# Altium footprint library 7-Connectors-12.PcbLib: 76 footprints (part 4 of 5)
Each footprint in its own frame and in the unit in brackets; x right, y up, seen from the top. Pads: shape width x height; smd on the part's side, far side on the other; paste and mask are expansions set on the pad; w line width, h text height; cw(c..) or ccw(c..) is an arc to the next point about the centre after c.
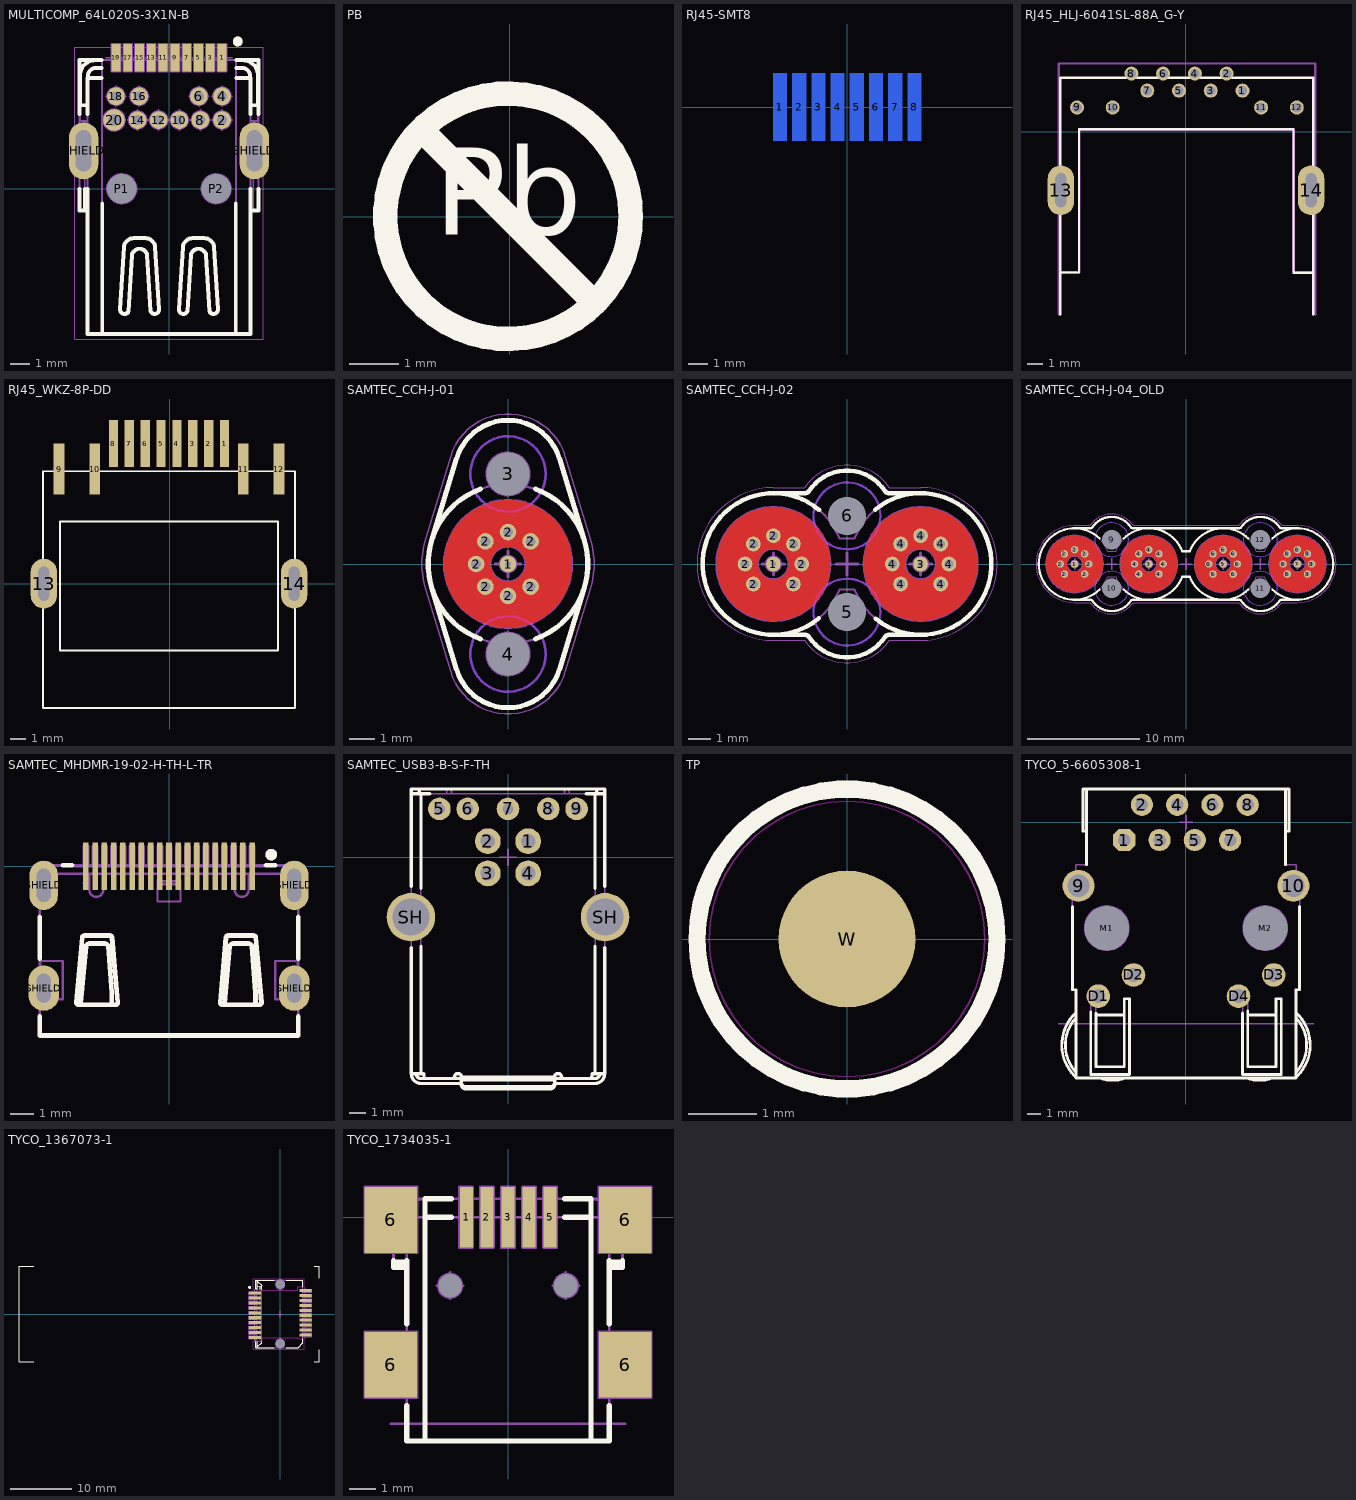
[diagram p3: the footprints below, top view; thin cyan lines are the x and y axes]

## MULTICOMP_64L020S-3X1N-B [mm] "0.4mm Pitch, Mini DisplayPort Receptacle, 20 Positions, Right Angled"
height 8.2
pads (24):
  rect 0.45x1.4 smd: 1(2.7,6.67) 3(2.1,6.67) 5(1.5,6.67) 7(0.9,6.67) 9(0.3,6.67) 11(-0.3,6.67) 13(-0.9,6.67) 15(-1.5,6.67) 17(-2.1,6.67) 19(-2.7,6.67)
  round 0.9 hole 0.5: 2(2.7,3.5) 4(2.7,4.71) 6(1.52,4.71) 8(1.6,3.5) 10(0.53,3.5) 12(-0.53,3.5) 14(-1.6,3.5) 16(-1.52,4.71) 18(-2.7,4.71)
  round 1.1 hole 0.6: 20(-2.8,3.5)
  round 1 hole 1.5 unplated mask+0.25: P1(-2.4,0) P2(2.4,0)
  oval 1.5x2.9 hole 0.8 slot 2.1 at 90 deg: SHIELD(-4.35,1.93) SHIELD(4.35,1.93)
Top Overlay:
  circle w0.25: c3.5,7.5 r0.125
  lines w0.2: -4.557,0 -4.557,-1.11 -4.15,-1.11 ; -4.557,3.81 -4.557,6.552 -3.425,6.552 ; -4.557,5.63 -4.536,5.63 ; -4.29,-1.11 -4.29,0 ; -4.15,0 -4.15,-7.4 4.15,-7.4 4.15,0 ; -4.15,3.81 -4.15,5.63 -3.425,5.63 ; -4.15,4.252 -4.536,4.252 -4.536,5.752 cw(c-3.736,5.752) -3.736,6.552 ; -4.129,5.63 -4.129,5.752 cw(c-3.729,5.752) -3.729,6.152 -3.425,6.152 ; -3.4,-7.4 -3.4,-0.75 ; -0.946,-6.234 -1.113,-3.392 ccw(c-1.5,-3.446) -1.888,-3.394 -2.058,-6.234 cw(c-2.267,-6.151) -2.492,-6.137 -2.293,-2.984 cw(c-1.794,-3.016) -1.794,-2.516 -1.206,-2.516 cw(c-1.206,-3.016) -0.707,-2.984 -0.508,-6.137 cw(c-0.733,-6.151) -0.942,-6.234 ; 0.942,-6.234 cw(c0.733,-6.151) 0.508,-6.137 0.707,-2.984 cw(c1.206,-3.016) 1.206,-2.516 1.794,-2.516 cw(c1.794,-3.016) 2.293,-2.984 2.492,-6.137 cw(c2.267,-6.151) 2.058,-6.234 1.888,-3.394 ccw(c1.5,-3.446) 1.113,-3.392 0.946,-6.234 ; 3.4,-7.4 3.4,-0.75 ; 3.425,5.63 4.15,5.63 4.15,3.81 ; 3.425,6.152 3.729,6.152 cw(c3.729,5.752) 4.129,5.752 4.129,5.63 ; 3.425,6.552 4.557,6.552 4.557,3.81 ; 3.736,6.552 cw(c3.736,5.752) 4.536,5.752 4.536,4.252 4.15,4.252 ; 4.15,-1.11 4.557,-1.11 4.557,0 ; 4.536,5.63 4.557,5.63
Mechanical 8:
  drawing of 167 lines, arcs and shapes, not listed
  text "8" at 1.513,2.486 h0.25
  text "20" at -2.972,2.486 h0.25
  text "16" at -0.762,4.572 h0.25
  text "14" at -1.763,2.486 h0.25
  text "12" at -0.688,2.486 h0.25
  text "10" at 0.38,2.486 h0.25
  text "6" at 0.635,4.572 h0.25
  text "2" at 2.608,2.486 h0.25
  text "4" at 3.4,4.572 h0.25
  text "18" at -3.81,4.572 h0.25
  text "19" at -2.859,5.581 h0.25
  text "17" at -2.25,5.581 h0.25
  text "15" at -1.655,5.581 h0.25
  text "13" at -1.055,5.581 h0.25
  text "11" at -0.425,5.581 h0.25
  text "9" at 0.208,5.581 h0.25
  text "7" at 0.813,5.581 h0.25
  text "5" at 1.407,5.581 h0.25
  text "3" at 2.007,5.581 h0.25
  text "1" at 2.638,5.581 h0.25
Mechanical 14:
  circle w0.25: c3.5,7.5 r0.125
  lines w0.1: -4.557,5.63 -4.536,5.63 ; -4.536,4.252 -4.15,4.252 ; -4.29,-1.11 -4.29,3.452 ; -4.15,-1.11 -4.557,-1.11 -4.557,6.552 4.557,6.552 4.557,-1.11 4.15,-1.11 ; -4.15,3.452 -4.536,3.452 -4.536,5.752 cw(c-3.736,5.752) -3.736,6.552 ; -4.129,5.63 -4.129,5.752 cw(c-3.729,5.752) -3.729,6.152 -3.4,6.152 ; -3.4,-7.4 -3.4,6.552 ; -3.4,5.63 -4.15,5.63 -4.15,-7.4 4.15,-7.4 4.15,5.63 3.4,5.63 ; -2.8,6.552 -2.8,6.96 -2.6,6.96 -2.6,6.552 ; -2.2,6.552 -2.2,6.96 -2,6.96 -2,6.552 ; -1.6,6.552 -1.6,6.96 -1.4,6.96 -1.4,6.552 ; -1,6.552 -1,6.96 -0.8,6.96 -0.8,6.552 ; -0.946,-6.234 -1.113,-3.392 ccw(c-1.5,-3.446) -1.888,-3.394 -2.058,-6.234 cw(c-2.267,-6.151) -2.492,-6.137 -2.293,-2.984 cw(c-1.794,-3.016) -1.794,-2.516 -1.206,-2.516 cw(c-1.206,-3.016) -0.707,-2.984 -0.508,-6.137 cw(c-0.733,-6.151) -0.942,-6.234 ; -0.4,6.552 -0.4,6.96 -0.2,6.96 -0.2,6.552 ; 0.2,6.552 0.2,6.96 0.4,6.96 0.4,6.552 ; 0.8,6.552 0.8,6.96 1,6.96 1,6.552 ; 0.942,-6.234 cw(c0.733,-6.151) 0.508,-6.137 0.707,-2.984 cw(c1.206,-3.016) 1.206,-2.516 1.794,-2.516 cw(c1.794,-3.016) 2.293,-2.984 2.492,-6.137 cw(c2.267,-6.151) 2.058,-6.234 1.888,-3.394 ccw(c1.5,-3.446) 1.113,-3.392 0.946,-6.234 ; 1.4,6.552 1.4,6.96 1.6,6.96 1.6,6.552 ; 2,6.552 2,6.96 2.2,6.96 2.2,6.552 ; 2.6,6.552 2.6,6.96 2.8,6.96 2.8,6.552 ; 3.4,-7.4 3.4,6.552 ; 3.4,6.152 3.729,6.152 cw(c3.729,5.752) 4.129,5.752 4.129,5.63 ; 3.736,6.552 cw(c3.736,5.752) 4.536,5.752 4.536,3.452 4.15,3.452 ; 4.15,4.252 4.536,4.252 ; 4.29,-1.11 4.29,3.452 ; 4.536,5.63 4.557,5.63
Mechanical 15:
  lines w0.05: -4.807,-7.65 4.807,-7.65 4.807,7.21 -4.807,7.21 -4.807,-7.65
3D body "MULTICOMP_64L020S-3x1N-B.stp": height 8.38, standoff -2.3, extent -4.55,-7.4 4.557,7.16

## PB [mm]
Top Overlay:
  circle w0.5: c-0.031,0.013 r2.5
  lines w0.5: -1.737,1.719 1.675,-1.693
  text "Pb" at -1.536,-0.948 h3.05
3D body "pb.stp": height 0.02, standoff 0, extent -2.725,-2.725 2.725,2.725

## RJ45-SMT8 [mil]
height 418.9
pads (8):
  rect 28x138 smd far side mask+2: 1(-137.8,0) 2(-98.43,0) 3(-59.06,0) 4(-19.69,0) 5(19.68,0) 6(59.06,0) 7(98.43,0) 8(137.8,0)
Bottom Overlay:
  lines w10: -308,-405 -308,-65 -174,-65 ; 175,-65 307.2,-65 307.2,-405
3D body "rj45-smt.stp": height 414.96, standoff -47.24, extent -300,-743.41 300,-9

## RJ45_HLJ-6041SL-88A_G-Y [mm]
height 10.64
pads (14):
  round 0.9 hole 0.6: 1(3.63,2.65) 2(2.61,3.75) 3(1.59,2.65) 4(0.57,3.75) 5(-0.45,2.65) 6(-1.47,3.75) 7(-2.49,2.65) 8(-3.51,3.75)
  round 0.9 hole 0.65: 9(-7,1.57) 10(-4.71,1.57) 11(4.83,1.57) 12(7.12,1.57)
  oval 1.7x3.2 hole 0.7 slot 2.2 at 90 deg: 13(-8.04,-3.75) 14(8.04,-3.75)
Top Overlay:
  lines w0.152: -8.09,-11.73 -8.09,3.47 8.185,3.47 8.185,-11.73 ; -8.077,-9.033 -6.877,-9.033 -6.877,0.162 6.909,0.162 6.909,-9.042 8.153,-9.042
Keep-Out Layer:
  lines w0.152: -8.096,-11.726 -8.096,-9.033 -6.877,-9.033 -6.877,0.162 6.915,0.162 6.915,-9.059 8.185,-9.059 8.185,-11.726
Mechanical 1:
  lines w0.152: -8.096,-11.726 -8.096,-9.026 -6.868,-9.026 -6.868,0.162 6.932,0.162 6.932,-9.059 ; 6.932,-9.051 8.168,-9.051 8.168,-11.726
Mechanical 14:
  lines w0.152: -8.096,-11.726 -8.096,-9.033 -6.877,-9.033 -6.877,0.162 6.915,0.162 6.915,-9.059 8.185,-9.059 8.185,-11.726
Mechanical 15:
  lines w0.152: -8.173,-11.726 -8.173,4.394 8.312,4.394 8.312,-11.726
3D body "hlj-6041sl-88a-y-g.stp": height 7.05, standoff -4, extent -8.02,-11.772 8.16,3.873

## RJ45_WKZ-8P-DD [mm]
height 10.64
pads (14):
  rect 0.6x3 smd: 1(3.51,9) 2(2.49,9) 3(1.47,9) 4(0.45,9) 5(-0.57,9) 6(-1.59,9) 7(-2.61,9) 8(-3.63,9)
  rect 0.7x3.28 smd: 9(-7.12,7.36) 10(-4.83,7.36) 11(4.71,7.36) 12(7,7.36)
  oval 1.7x3.2 hole 0.7 slot 2.2 at 90 deg: 13(-8.1,0) 14(7.98,0)
Top Overlay:
  lines w0.127: -8.15,-7.98 -8.15,7.22 8.03,7.22 8.03,-7.98 -8.15,-7.98 ; -7.06,-4.3 -7.06,4 6.94,4 6.94,-4.3 -7.06,-4.3
3D body "wkz-8p-dd.stp": height 7.09, standoff -4.5, extent -8.227,-7.754 7.973,10.246

## SAMTEC_CCH-J-01 [mm] "CCH - Bull's Eye Low Cost High Performance SMA Test Point"
height 7.62
pads (10):
  round 0.66 hole 0.25: 1(0,0)
  round 0.66 hole 0.4 mask-0.2: 2(-1.27,0) 2(-0.898,-0.898) 2(-0.898,0.898) 2(0,-1.27) 2(0,1.27) 2(0.898,-0.898) 2(0.898,0.898)
  round 1 hole 1.7 unplated mask+0.35: 3(0,3.581) 4(0,-3.581)
Top Layer:
  region: -2.54,0.05 -2.544,-0.203 -2.454,-0.702 -2.267,-1.173 -1.991,-1.597 -1.636,-1.959 -1.217,-2.244 -0.75,-2.44 -0.253,-2.54 0.253,-2.54 0.75,-2.44 1.217,-2.244 1.636,-1.959 1.991,-1.597 2.267,-1.173 2.454,-0.702 2.544,-0.203 2.54,0.05 0.698,0.05 0.699,-0.046 0.66,-0.233 0.573,-0.403 0.442,-0.542 0.279,-0.642 0.095,-0.693 -0.096,-0.693 -0.279,-0.642 -0.442,-0.542 -0.573,-0.403 -0.66,-0.233 -0.699,-0.046 -0.698,0.05
  region: -2.54,-0.05 -0.698,-0.05 -0.699,0.046 -0.66,0.233 -0.573,0.403 -0.442,0.542 -0.279,0.642 -0.096,0.693 0.095,0.693 0.279,0.642 0.442,0.542 0.573,0.403 0.66,0.233 0.699,0.046 0.698,-0.05 2.54,-0.05 2.544,0.203 2.454,0.702 2.267,1.173 1.991,1.597 1.636,1.959 1.217,2.244 0.75,2.44 0.253,2.54 -0.253,2.54 -0.75,2.44 -1.217,2.244 -1.636,1.959 -1.991,1.597 -2.267,1.173 -2.454,0.702 -2.544,0.203
Bottom Layer keep-out:
  circle w0.1: c0,3.581 r1.5
  circle w0.1: c0,-3.581 r1.5
Top Overlay:
  lines w0.2: -1.096,-2.98 cw(c0,0) -1.096,2.98 ; 1.096,-2.98 ccw(c0,0) 1.096,2.98 ; 3.038,-0.923 2.041,-4.202 cw(c0,-3.581) -2.041,-4.202 -3.038,-0.923 cw(c0,0) -3.038,0.923 -2.041,4.202 cw(c0,3.581) 2.041,4.202 3.038,0.923
Bottom Solder:
  circle w0.33: c0.898,-0.898 r0.165
  circle w0.33: c0,-1.27 r0.165
  circle w0.33: c-0.898,-0.898 r0.165
  circle w0.33: c-1.27,0 r0.165
  circle w0.33: c-0.898,0.898 r0.165
  circle w0.33: c0,1.27 r0.165
  circle w0.33: c0.898,0.898 r0.165
Mechanical 8:
  circle w0.1: c0,0 r2.54
  circle w0.1: c0,3.581 r0.85
  circle w0.1: c0,-3.581 r0.85
  circle w0.1: c0,0 r0.7
  circle w0.1: c0,0 r0.125
  circle w0.1: c0,0 r0.32
  circle w0.1: c0.898,0.898 r0.33
  circle w0.1: c0.898,0.898 r0.205
  circle w0.1: c0,1.27 r0.33
  circle w0.1: c0,1.27 r0.205
  circle w0.1: c0.898,-0.898 r0.33
  circle w0.1: c0.898,-0.898 r0.205
  circle w0.1: c0,-1.27 r0.33
  circle w0.1: c0,-1.27 r0.205
  circle w0.1: c-0.898,0.898 r0.33
  circle w0.1: c-0.898,0.898 r0.205
  circle w0.1: c-0.898,-0.898 r0.33
  circle w0.1: c-0.898,-0.898 r0.205
  circle w0.1: c-1.27,0 r0.33
  circle w0.1: c-1.27,0 r0.205
  circle w0.1: c0,0 r1.27
  lines w0.1: -2.54,0 -1.62,0 -0.7,0 ; -1.415,-0.145 -1.27,0 -1.415,0.145 ; -1.103,-0.898 -0.898,-0.898 -0.898,-1.103 ; -1.103,0.898 -0.898,0.898 -0.898,1.103 ; -0.5,-3.581 0,-3.581 ; -0.5,0 0,0 ; -0.5,3.581 0,3.581 ; -0.145,-1.415 0,-1.27 0.145,-1.415 ; -0.145,1.415 0,1.27 0.145,1.415 ; 0,-4.081 0,-3.581 ; 0,-3.081 0,-3.581 ; 0,-0.5 0,0 ; 0,0.5 0,0 ; 0,3.081 0,3.581 ; 0,4.081 0,3.581 ; 0.5,-3.581 0,-3.581 ; 0.5,0 0,0 ; 0.5,3.581 0,3.581 ; 0.7,0 1.62,0 2.54,0 ; 0.898,-1.103 0.898,-0.898 1.103,-0.898 ; 0.898,1.103 0.898,0.898 1.103,0.898
Mechanical 14:
  circle w0.1: c0,0 r3.175
  circle w0.1: c0,0 r1.651
  circle w0.1: c0,0 r1.378
  lines w0.1: -0.54,-3.129 ccw(c0,-3.581) 0.54,-3.129 ; -0.54,3.129 cw(c0,3.581) 0.54,3.129 ; -3.038,-0.923 cw(c0,0) -3.038,0.923 -2.041,4.202 cw(c0,3.581) 2.041,4.202 3.038,0.923 cw(c0,0) 3.038,-0.923 2.041,-4.202 cw(c0,-3.581) -2.041,-4.202 -3.038,-0.923
Mechanical 15:
  lines w0.05: -3.277,-0.996 cw(c0,0) -3.277,0.996 -2.281,4.275 cw(c0,3.581) 2.281,4.275 3.277,0.996 cw(c0,0) 3.277,-0.996 2.281,-4.275 cw(c0,-3.581) -2.281,-4.275 -3.277,-0.996
Drill Drawing:
  lines w0.2: 1.651,0 0.8,0 ; 0.8,0 0.95,-0.15 0.95,0.15 0.8,0
3D body "SAMTEC_CCH-J-01_Part1.stp": height 7.62, standoff 0, extent -3.175,-5.715 3.175,5.715
3D body "SAMTEC_CCH-J-01_Part2.stp": height 3.16, standoff -2.62, extent -1.395,-4.972 1.395,4.977

## SAMTEC_CCH-J-02 [mm] "2 Positions CCH - Bull's Eye Low Cost High Performance SMA Test Point"
height 7.62
pads (18):
  round 0.66 hole 0.25: 1(-3.302,0) 3(3.302,0)
  round 0.66 hole 0.4 mask-0.2: 2(-4.572,0) 2(-4.2,-0.898) 2(-4.2,0.898) 2(-3.302,1.27) 2(-2.404,-0.898) 2(-2.404,0.898) 2(-2.032,0) 4(2.032,0) 4(2.404,-0.898) 4(2.404,0.898) 4(3.302,1.27) 4(4.2,-0.898) 4(4.2,0.898) 4(4.572,0)
  round 1 hole 1.7 unplated mask+0.35: 5(0,-2.159) 6(0,2.159)
Top Layer:
  region: -5.842,0.05 -5.847,-0.203 -5.756,-0.702 -5.569,-1.173 -5.293,-1.597 -4.938,-1.959 -4.519,-2.244 -4.052,-2.44 -3.555,-2.54 -3.049,-2.54 -2.552,-2.44 -2.085,-2.244 -1.666,-1.959 -1.311,-1.597 -1.035,-1.173 -0.848,-0.702 -0.758,-0.203 -0.762,0.05 -2.604,0.05 -2.603,-0.046 -2.642,-0.233 -2.729,-0.403 -2.86,-0.542 -3.023,-0.642 -3.207,-0.693 -3.398,-0.693 -3.581,-0.642 -3.744,-0.542 -3.875,-0.403 -3.962,-0.233 -4.001,-0.046 -4,0.05
  region: -5.842,-0.05 -4,-0.05 -4.001,0.046 -3.962,0.233 -3.875,0.403 -3.744,0.542 -3.581,0.642 -3.398,0.693 -3.207,0.693 -3.023,0.642 -2.86,0.542 -2.729,0.403 -2.642,0.233 -2.603,0.046 -2.604,-0.05 -0.762,-0.05 -0.758,0.203 -0.848,0.702 -1.035,1.173 -1.311,1.597 -1.666,1.959 -2.085,2.244 -2.552,2.44 -3.049,2.54 -3.555,2.54 -4.052,2.44 -4.519,2.244 -4.938,1.959 -5.293,1.597 -5.569,1.173 -5.756,0.702 -5.847,0.203
  region: 0.762,0.05 0.758,-0.203 0.848,-0.702 1.035,-1.173 1.311,-1.597 1.666,-1.959 2.085,-2.244 2.552,-2.44 3.049,-2.54 3.555,-2.54 4.052,-2.44 4.519,-2.244 4.938,-1.959 5.293,-1.597 5.569,-1.173 5.756,-0.702 5.846,-0.203 5.842,0.05 4,0.05 4.001,-0.046 3.962,-0.233 3.875,-0.403 3.744,-0.542 3.581,-0.642 3.398,-0.693 3.207,-0.693 3.023,-0.642 2.86,-0.542 2.729,-0.403 2.642,-0.233 2.603,-0.046 2.604,0.05
  region: 0.762,-0.05 2.604,-0.05 2.603,0.046 2.642,0.233 2.729,0.403 2.86,0.542 3.023,0.642 3.207,0.693 3.398,0.693 3.581,0.642 3.744,0.542 3.875,0.403 3.962,0.233 4.001,0.046 4,-0.05 5.842,-0.05 5.846,0.203 5.756,0.702 5.569,1.173 5.293,1.597 4.938,1.959 4.519,2.244 4.052,2.44 3.555,2.54 3.049,2.54 2.552,2.44 2.085,2.244 1.666,1.959 1.311,1.597 1.035,1.173 0.848,0.702 0.758,0.203
Bottom Layer keep-out:
  circle w0.1: c0,2.159 r1.5
  circle w0.1: c0,-2.159 r1.5
Top Overlay:
  lines w0.2: -3.302,-3.175 -1.901,-3.175 cw(c-1.901,-3.429) -1.69,-3.288 ccw(c0,-2.159) 1.69,-3.288 cw(c1.901,-3.429) 1.901,-3.175 3.302,-3.175 ; -3.302,3.175 -1.901,3.175 ccw(c-1.901,3.429) -1.69,3.288 cw(c0,2.159) 1.69,3.288 ccw(c1.901,3.429) 1.901,3.175 3.302,3.175 ; -1.259,-2.43 cw(c-3.302,0) -1.25,2.423 ; 1.261,2.432 cw(c3.302,0) 1.295,-2.46
Bottom Solder:
  circle w0.33: c-4.2,-0.898 r0.165
  circle w0.33: c-4.572,0 r0.165
  circle w0.33: c-4.2,0.898 r0.165
  circle w0.33: c-3.302,1.27 r0.165
  circle w0.33: c-2.404,0.898 r0.165
  circle w0.33: c-2.032,0 r0.165
  circle w0.33: c-2.404,-0.898 r0.165
  circle w0.33: c2.404,-0.898 r0.165
  circle w0.33: c2.032,0 r0.165
  circle w0.33: c2.404,0.898 r0.165
  circle w0.33: c3.302,1.27 r0.165
  circle w0.33: c4.2,0.898 r0.165
  circle w0.33: c4.572,0 r0.165
  circle w0.33: c4.2,-0.898 r0.165
Mechanical 8:
  circle w0.127: c3.302,0 r1.62
  circle w0.127: c3.302,0 r2.54
  circle w0.127: c3.302,0 r0.7
  circle w0.127: c3.302,0 r0.125
  circle w0.127: c3.302,0 r0.32
  circle w0.127: c4.2,-0.898 r0.33
  circle w0.127: c4.2,-0.898 r0.205
  circle w0.127: c4.572,0 r0.33
  circle w0.127: c4.572,0 r0.205
  circle w0.127: c2.404,-0.898 r0.33
  circle w0.127: c2.404,-0.898 r0.205
  circle w0.127: c2.032,0 r0.33
  circle w0.127: c2.032,0 r0.205
  circle w0.127: c4.2,0.898 r0.33
  circle w0.127: c4.2,0.898 r0.205
  circle w0.127: c2.404,0.898 r0.33
  circle w0.127: c2.404,0.898 r0.205
  circle w0.127: c3.302,1.27 r0.33
  circle w0.127: c3.302,1.27 r0.205
  circle w0.127: c3.302,0 r1.27
  circle w0.127: c-3.302,0 r1.62
  circle w0.127: c-3.302,0 r2.54
  circle w0.127: c-3.302,0 r0.7
  circle w0.127: c-3.302,0 r0.125
  circle w0.127: c-3.302,0 r0.32
  circle w0.127: c-2.404,-0.898 r0.33
  circle w0.127: c-2.404,-0.898 r0.205
  circle w0.127: c-2.032,0 r0.33
  circle w0.127: c-2.032,0 r0.205
  circle w0.127: c-4.2,-0.898 r0.33
  circle w0.127: c-4.2,-0.898 r0.205
  circle w0.127: c-4.572,0 r0.33
  circle w0.127: c-4.572,0 r0.205
  circle w0.127: c-2.404,0.898 r0.33
  circle w0.127: c-2.404,0.898 r0.205
  circle w0.127: c-4.2,0.898 r0.33
  circle w0.127: c-4.2,0.898 r0.205
  circle w0.127: c-3.302,1.27 r0.33
  circle w0.127: c-3.302,1.27 r0.205
  circle w0.127: c-3.302,0 r1.27
  lines w0.127: -4.717,-0.145 -4.572,0 -4.717,0.145 ; -4.405,-0.898 -4.2,-0.898 -4.2,-1.103 ; -4.405,0.898 -4.2,0.898 -4.2,1.103 ; -3.447,1.415 -3.302,1.27 -3.157,1.415 ; -3.302,2.54 -3.302,1.62 ; -2.404,-1.103 -2.404,-0.898 -2.199,-0.898 ; -2.404,1.103 -2.404,0.898 -2.199,0.898 ; -1.887,-0.145 -2.032,0 -1.887,0.145 ; -1.682,0 -0.762,0 ; -0.5,-2.159 0,-2.159 ; -0.5,2.159 0,2.159 ; 0,-2.659 0,-2.159 ; 0,-1.659 0,-2.159 ; 0,-0.5 0,0 ; 0,0.5 0,0 ; 0,1.659 0,2.159 ; 0,2.659 0,2.159 ; 0.5,-2.159 0,-2.159 ; 0.5,2.159 0,2.159 ; 1.887,-0.145 2.032,0 1.887,0.145 ; 2.199,-0.898 2.404,-0.898 2.404,-1.103 ; 2.199,0.898 2.404,0.898 2.404,1.103 ; 3.157,1.415 3.302,1.27 3.447,1.415 ; 3.302,2.54 3.302,1.62 ; 4.2,-1.103 4.2,-0.898 4.405,-0.898 ; 4.2,1.103 4.2,0.898 4.405,0.898 ; 4.717,-0.145 4.572,0 4.717,0.145 ; 4.922,0 5.842,0 ; -3.302,0 -3.302,-0.5 -3.302,0 ; -3.302,0 -2.802,0 -3.302,0 ; -3.302,0 -3.302,0.5 -3.302,0 ; -3.302,0 -3.802,0 -3.302,0 ; -3.302,1.62 -3.302,0.7 -3.302,1.62 ; 0,0 0.5,0 0,0 ; 0,0 -0.5,0 0,0 ; 3.302,0 3.302,-0.5 3.302,0 ; 3.302,0 3.802,0 3.302,0 ; 3.302,0 3.302,0.5 3.302,0 ; 3.302,0 2.802,0 3.302,0 ; 3.302,1.62 3.302,0.7 3.302,1.62
Mechanical 14:
  circle w0.1: c0,-2.159 r0.679
  circle w0.1: c0,2.159 r0.679
  circle w0.1: c3.302,0 r1.651
  circle w0.1: c3.302,0 r1.378
  circle w0.1: c-3.302,0 r1.651
  circle w0.1: c-3.302,0 r1.378
  lines w0.1: -4.225,-3.038 ccw(c-3.302,0) -2.379,-3.038 ; -4.225,3.038 cw(c-3.302,0) -2.379,3.038 ; -3.302,-3.175 -1.901,-3.175 cw(c-1.901,-3.429) -1.69,-3.288 ccw(c0,-2.159) 1.69,-3.288 cw(c1.901,-3.429) 1.901,-3.175 3.302,-3.175 ; -3.302,3.175 -1.901,3.175 ccw(c-1.901,3.429) -1.69,3.288 cw(c0,2.159) 1.69,3.288 ccw(c1.901,3.429) 1.901,3.175 3.302,3.175 ; 2.379,-3.038 ccw(c3.302,0) 4.225,-3.038 ; 2.379,3.038 cw(c3.302,0) 4.225,3.038 ; -0.34,-1.143 cw(c-3.302,0) -0.34,1.143 0.34,1.143 cw(c3.302,0) 0.34,-1.143 -0.34,-1.143
Mechanical 15:
  lines w0.05: -1.901,-3.425 -3.302,-3.425 cw(c-3.302,0) -3.302,3.425 -1.901,3.425 ; -1.897,-3.427 ccw(c0,-2.159) 1.897,-3.427 ; -1.897,3.427 cw(c0,2.159) 1.897,3.427 ; 1.901,-3.425 3.302,-3.425 ccw(c3.302,0) 3.302,3.425 1.901,3.425
Drill Drawing:
  lines w0.1: -3.302,2.9 -3.302,0.8 ; 3.302,2.9 3.302,0.8 ; -3.302,0.8 -3.452,0.95 -3.152,0.95 -3.302,0.8 ; 3.302,0.8 3.152,0.95 3.452,0.95 3.302,0.8
3D body "SAMTEC_CCH-J-02_Part2.stp": height 3.16, standoff -2.62, extent -1.395,-3.55 1.395,3.554
3D body "SAMTEC_CCH-J-02_Part1.stp": height 7.62, standoff 0, extent -6.477,-4.191 6.477,4.191

## SAMTEC_CCH-J-04_OLD [mm] "4 Positions CCH - Bull's Eye Low Cost High Performance SMA Test Point"
height 7.62
pads (36):
  round 0.66 hole 0.25: 1(-9.902,0) 3(-3.298,0) 5(3.298,0) 7(9.902,0)
  round 0.66 hole 0.4: 2(-11.172,0) 2(-10.8,-0.898) 2(-10.8,0.898) 2(-9.902,1.27) 2(-9.004,-0.898) 2(-9.004,0.898) 2(-8.632,0) 4(-4.568,0) 4(-4.196,-0.898) 4(-4.196,0.898) 4(-3.298,1.27) 4(-2.4,-0.898) 4(-2.4,0.898) 4(-2.028,0) 6(2.028,0) 6(2.4,-0.898) 6(2.4,0.898) 6(3.298,1.27) 6(4.196,-0.898) 6(4.196,0.898) 6(4.568,0) 8(8.632,0) 8(9.004,-0.898) 8(9.004,0.898) 8(9.902,1.27) 8(10.8,-0.898) 8(10.8,0.898) 8(11.172,0)
  round 1 hole 1.7 unplated mask+0.35: 9(-6.6,2.159) 10(-6.6,-2.159) 11(6.6,-2.159) 12(6.6,2.159)
Top Layer:
  circle w1.84: c9.902,0 r1.62
  circle w1.84: c3.298,0 r1.62
  circle w1.84: c-3.298,0 r1.62
  circle w1.84: c-9.902,0 r1.62
Bottom Layer keep-out:
  circle w0.1: c-6.604,-2.159 r1.5
  circle w0.1: c-6.604,2.159 r1.5
  circle w0.1: c6.604,-2.159 r1.5
  circle w0.1: c6.604,2.159 r1.5
Top Overlay:
  lines w0.2: -10.829,-3.038 ccw(c-9.906,0) -8.983,-3.038 ; -10.829,3.038 cw(c-9.906,0) -8.983,3.038 ; -9.906,-3.175 -8.505,-3.175 cw(c-8.505,-3.429) -8.294,-3.288 ccw(c-6.604,-2.159) -4.914,-3.288 cw(c-4.703,-3.429) -4.703,-3.175 4.703,-3.175 cw(c4.703,-3.429) 4.914,-3.288 ccw(c6.604,-2.159) 8.294,-3.288 cw(c8.505,-3.429) 8.505,-3.175 9.906,-3.175 ; -9.906,3.175 -8.505,3.175 ccw(c-8.505,3.429) -8.294,3.288 cw(c-6.604,2.159) -4.914,3.288 ccw(c-4.703,3.429) -4.703,3.175 4.703,3.175 ccw(c4.703,3.429) 4.914,3.288 cw(c6.604,2.159) 8.294,3.288 ccw(c8.505,3.429) 8.505,3.175 9.906,3.175 ; -7.678,-2.262 cw(c-9.906,0) -7.678,2.262 ; -5.53,-2.262 ccw(c-3.302,0) -0.34,-1.143 0.34,-1.143 ccw(c3.302,0) 5.53,-2.262 ; -5.53,2.262 cw(c-3.302,0) -0.34,1.143 0.34,1.143 cw(c3.302,0) 5.53,2.262 ; -4.225,-3.038 ccw(c-3.302,0) -2.379,-3.038 ; -4.225,3.038 cw(c-3.302,0) -2.379,3.038 ; 2.379,-3.038 ccw(c3.302,0) 4.225,-3.038 ; 2.379,3.038 cw(c3.302,0) 4.225,3.038 ; 7.678,-2.262 ccw(c9.906,0) 7.678,2.262 ; 8.983,-3.038 ccw(c9.906,0) 10.829,-3.038 ; 8.983,3.038 cw(c9.906,0) 10.829,3.038
Mechanical 8:
  drawing of 224 lines, arcs and shapes, not listed
Mechanical 14:
  circle w0.1: c-6.604,-2.159 r0.679
  circle w0.1: c-6.604,2.159 r0.679
  circle w0.1: c-3.302,0 r1.651
  circle w0.1: c-3.302,0 r1.378
  circle w0.1: c-9.906,0 r1.651
  circle w0.1: c-9.906,0 r1.378
  circle w0.1: c6.604,-2.159 r0.679
  circle w0.1: c6.604,2.159 r0.679
  circle w0.1: c9.906,0 r1.651
  circle w0.1: c9.906,0 r1.378
  circle w0.1: c3.302,0 r1.651
  circle w0.1: c3.302,0 r1.378
  lines w0.1: -10.829,-3.038 ccw(c-9.906,0) -8.983,-3.038 ; -10.829,3.038 cw(c-9.906,0) -8.983,3.038 ; -9.906,-3.175 -8.505,-3.175 cw(c-8.505,-3.429) -8.294,-3.288 ccw(c-6.604,-2.159) -4.914,-3.288 cw(c-4.703,-3.429) -4.703,-3.175 4.703,-3.175 cw(c4.703,-3.429) 4.914,-3.288 ccw(c6.604,-2.159) 8.294,-3.288 cw(c8.505,-3.429) 8.505,-3.175 9.906,-3.175 ; -9.906,3.175 -8.505,3.175 ccw(c-8.505,3.429) -8.294,3.288 cw(c-6.604,2.159) -4.914,3.288 ccw(c-4.703,3.429) -4.703,3.175 4.703,3.175 ccw(c4.703,3.429) 4.914,3.288 cw(c6.604,2.159) 8.294,3.288 ccw(c8.505,3.429) 8.505,3.175 9.906,3.175 ; -4.225,-3.038 ccw(c-3.302,0) -2.379,-3.038 ; -4.225,3.038 cw(c-3.302,0) -2.379,3.038 ; 2.379,-3.038 ccw(c3.302,0) 4.225,-3.038 ; 2.379,3.038 cw(c3.302,0) 4.225,3.038 ; 8.983,-3.038 ccw(c9.906,0) 10.829,-3.038 ; 8.983,3.038 cw(c9.906,0) 10.829,3.038 ; -6.944,-1.143 cw(c-9.906,0) -6.944,1.143 -6.264,1.143 cw(c-3.302,0) -0.34,1.143 0.34,1.143 cw(c3.302,0) 6.264,1.143 6.944,1.143 cw(c9.906,0) 6.944,-1.143 6.264,-1.143 cw(c3.302,0) 0.34,-1.143 -0.34,-1.143 cw(c-3.302,0) -6.264,-1.143 -6.944,-1.143